# Altium footprint library PCBLIB.PcbLib: 103 footprints (part 6 of 7)
Each footprint in its own frame and in the unit in brackets; x right, y up, seen from the top. Pads: shape width x height; smd on the part's side, far side on the other; paste and mask are expansions set on the pad; w line width, h text height; cw(c..) or ccw(c..) is an arc to the next point about the centre after c.
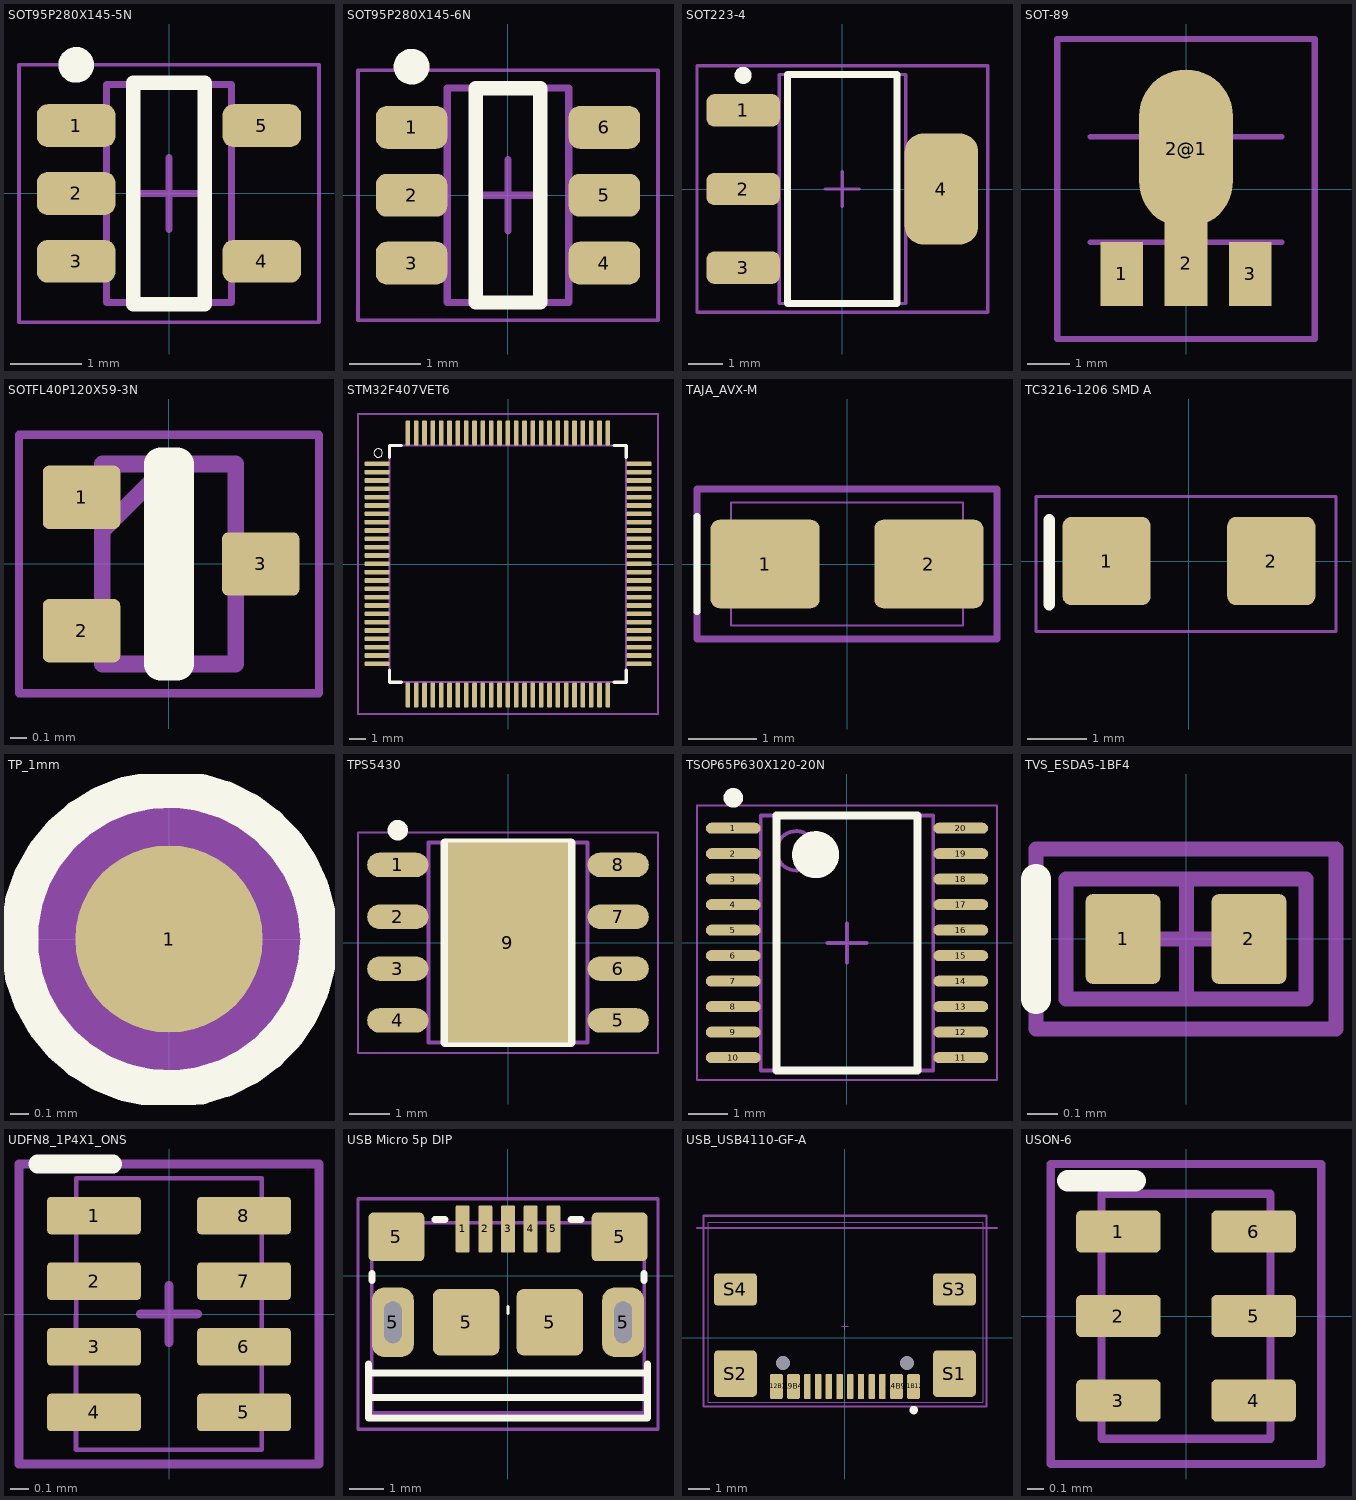
[diagram p5: the footprints below, top view; thin cyan lines are the x and y axes]

## SOT95P280X145-5N [mm]
pads (5):
  rrect50% 1.1x0.6 smd mask+0.05: 1(-1.3,0.95) 2(-1.3,0) 3(-1.3,-0.95) 4(1.3,-0.95) 5(1.3,0.95)
Top Overlay:
  circle w0.25: c-1.3,1.8 r0.125
  lines w0.2: -0.5,-1.55 -0.5,1.55 0.5,1.55 0.5,-1.55 -0.5,-1.55
Top Component Outline:
  lines w0.05: -2.1,-1.8 -2.1,1.8 2.1,1.8 2.1,-1.8 -2.1,-1.8
Top Assembly:
  lines w0.1: -0.875,-1.525 -0.875,1.525 0.875,1.525 0.875,-1.525 -0.875,-1.525
Top Designator:
  text ".Designator" at -1.578,-0.046 h0.7
Bottom 3D Body:
  lines w0.1: -0.5,0 0.5,0 ; 0,-0.5 0,0.5
3D body "SOT95P280X145-5N.step": height 1.45, standoff 0, extent -1.5,-1.525 1.5,1.525

## SOT95P280X145-6N [mm]
pads (6):
  rrect50% 1x0.6 smd mask+0.05: 1(-1.35,0.95) 2(-1.35,0) 3(-1.35,-0.95) 4(1.35,-0.95) 5(1.35,0) 6(1.35,0.95)
Top Overlay:
  circle w0.25: c-1.35,1.8 r0.125
  lines w0.2: -0.45,-1.5 0.45,-1.5 0.45,1.5 -0.45,1.5 -0.45,-1.5
Top Component Outline:
  lines w0.05: -2.1,-1.75 2.1,-1.75 2.1,1.75 -2.1,1.75 -2.1,-1.75
Top Assembly:
  lines w0.1: -0.85,-1.5 -0.85,1.5 0.85,1.5 0.85,-1.5 -0.85,-1.5
Bottom Designator:
  text ".Comment" at -0.133,1.091 h0.64
Mechanical 11:
  text ".Designator" at -0.133,1.091 h0.64
Bottom 3D Body:
  lines w0.1: -0.5,0 0.5,0 ; 0,-0.5 0,0.5
3D body "SOT95P280X145-6N.step": height 1.45, standoff 0, extent -1.5,-1.5 1.5,1.5

## SOT223-4 [mm]
pads (4):
  rrect50% 2.15x0.95 smd mask+0.05: 1(-2.9,2.3) 2(-2.9,0) 3(-2.9,-2.3)
  rrect50% 2.15x3.25 smd mask+0.05: 4(2.9,0)
Top Overlay:
  circle w0.25: c-2.9,3.325 r0.125
  lines w0.2: -1.6,-3.35 1.6,-3.35 1.6,3.35 -1.6,3.35 -1.6,-3.35
Top Component Outline:
  lines w0.1: -0.5,0 0.5,0 ; 0,-0.5 0,0.5 ; -4.25,-3.6 -4.25,3.6 4.25,3.6 4.25,-3.6 -4.25,-3.6
Top Designator:
  text ".Value" at -1.019,-0.249 h0.8
Top Courtyard:
  text ".Comment" at -0.187,1.218 h0.64
Top 3D Body:
  lines w0.1: -1.85,-3.35 1.85,-3.35 1.85,3.35 -1.85,3.35 -1.85,-3.35
  text ".Designator" at -0.187,1.218 h0.64
3D body "SOT230P700X180-4N.step": height 1.8, standoff 0, extent -3.5,-3.35 3.5,3.35

## SOT-89 [mm]
pads (4):
  rect 1x1.5 smd paste-2 mask+0: 1(-1.499,-1.981) 3(1.499,-1.981)
  rect 1x2 smd paste-2 mask+0: 2(0,-1.727)
  oval 2.2x3.7 smd paste-3: 2@1(0,0.94)
Top Paste:
  region: 0.9,0 -0.901,0 -0.901,2.2 0.9,2.2
  region: -1.1,-2.684 -1.903,-2.684 -1.903,-1.28 -1.1,-1.28
  region: 1.9,-2.682 1.101,-2.682 1.101,-1.28 1.9,-1.28
  region: 0.4,-2.683 -0.4,-2.683 -0.4,-1.28 0.4,-1.28
Top Solder:
  region: 0.525,-2.776 -0.525,-2.776 -0.525,-1.2 0.525,-1.2
  region: 2.025,-2.78 0.977,-2.78 0.977,-1.2 2.025,-1.2
  region: -0.975,-2.779 -2.028,-2.779 -2.028,-1.2 -0.975,-1.2
Top Component Outline:
  lines w0.15: -3,-3.5 -3,3.5 3,3.5 3,-3.5 -3,-3.5
Bottom Courtyard:
  region: 0.787,1.575 0.787,1.295 -0.787,1.295 -0.787,1.321 -0.787,1.575 -0.356,2.007 0.356,2.007
  region: 0.279,-2.111 -0.28,-2.111 -0.28,-1.27 0.279,-1.27
  region: 1.727,-2.108 1.27,-2.108 1.27,-1.27 1.727,-1.27
  region: -1.27,-2.11 -1.728,-2.11 -1.728,-1.27 -1.27,-1.27
  lines w0.127: -2.235,-1.245 2.235,-1.245 ; -2.235,1.219 2.235,1.219
  lines w0.2: -0.787,1.295 -0.787,1.575 -0.356,2.007 0.356,2.007 0.787,1.575 0.787,1.295 -0.787,1.295
3D body "step_temp.STEP": height 1.6, standoff 0, extent -2.275,-2.292 2.275,1.877

## SOTFL40P120X59-3N [mm]
pads (3):
  rrect20% 0.465x0.38 smd mask+0.05: 1(-0.525,0.4) 2(-0.525,-0.4) 3(0.55,0)
Top Overlay:
  lines w0.2: -0.05,-0.6 -0.05,0.6 0.05,0.6 0.05,-0.6 -0.05,-0.6
Top Component Outline:
  lines w0.05: -0.9,-0.775 -0.9,0.775 0.9,0.775 0.9,-0.775 -0.9,-0.775
Top Assembly:
  lines w0.1: -0.4,0.2 0,0.6 ; -0.4,-0.6 -0.4,0.6 0.4,0.6 0.4,-0.6 -0.4,-0.6
3D body "ESD5V3U2U03FH6327XTSA1.stp": height 0.59, standoff 0, extent -0.6,-0.6 0.6,0.6

## STM32F407VET6 [mm]
height 9
pads (100):
  rrect50% 1.5x0.28 smd mask+0.05: 1(-7.862,6.013) 2(-7.862,5.512) 3(-7.862,5.012) 4(-7.862,4.513) 5(-7.862,4.012) 6(-7.862,3.512) 7(-7.862,3.012) 8(-7.862,2.512) 9(-7.862,2.013) 10(-7.862,1.512) 11(-7.862,1.013) 12(-7.862,0.512) 13(-7.862,0.012) 14(-7.862,-0.487) 15(-7.862,-0.988) 16(-7.862,-1.488) 17(-7.862,-1.988) 18(-7.862,-2.488) 19(-7.862,-2.987) 20(-7.862,-3.488) 21(-7.862,-3.988) 22(-7.862,-4.488) 23(-7.862,-4.988) 24(-7.862,-5.487) 25(-7.862,-5.988) 51(7.862,-5.99) 52(7.862,-5.49) 53(7.862,-4.99) 54(7.862,-4.49) 55(7.862,-3.99) 56(7.862,-3.49) 57(7.862,-2.99) 58(7.862,-2.49) 59(7.862,-1.99) 60(7.862,-1.49) 61(7.862,-0.99) 62(7.862,-0.49) 63(7.862,0.01) 64(7.862,0.51) 65(7.862,1.01) 66(7.862,1.51) 67(7.862,2.01) 68(7.862,2.51) 69(7.862,3.01) 70(7.862,3.51) 71(7.862,4.01) 72(7.862,4.51) 73(7.862,5.01) 74(7.862,5.51) 75(7.862,6.01)
  rrect50% 0.28x1.5 smd mask+0.05: 26(-6.009,-7.866) 27(-5.509,-7.866) 28(-5.009,-7.866) 29(-4.509,-7.866) 30(-4.009,-7.866) 31(-3.509,-7.866) 32(-3.009,-7.866) 33(-2.509,-7.866) 34(-2.009,-7.866) 35(-1.509,-7.866) 36(-1.009,-7.866) 37(-0.509,-7.866) 38(-0.009,-7.866) 39(0.491,-7.866) 40(0.991,-7.866) 41(1.491,-7.866) 42(1.991,-7.866) 43(2.491,-7.866) 44(2.991,-7.866) 45(3.491,-7.866) 46(3.991,-7.866) 47(4.491,-7.866) 48(4.991,-7.866) 49(5.491,-7.866) 50(5.991,-7.866) 76(5.991,7.866) 77(5.491,7.866) 78(4.991,7.866) 79(4.491,7.866) 80(3.991,7.866) 81(3.491,7.866) 82(2.991,7.866) 83(2.491,7.866) 84(1.991,7.866) 85(1.491,7.866) 86(0.991,7.866) 87(0.491,7.866) 88(-0.009,7.866) 89(-0.509,7.866) 90(-1.009,7.866) 91(-1.509,7.866) 92(-2.009,7.866) 93(-2.509,7.866) 94(-3.009,7.866) 95(-3.509,7.866) 96(-4.009,7.866) 97(-4.509,7.866) 98(-5.009,7.866) 99(-5.509,7.866) 100(-6.009,7.866)
Top Overlay:
  circle w0: c-7.787,6.656 r0.254
  lines w0.203: -7.109,-6.382 -7.109,-7.088 -6.403,-7.088 ; -7.109,6.407 -7.109,7.113 -6.403,7.113 ; 6.385,-7.088 7.091,-7.088 7.091,-6.382 ; 6.385,7.113 7.091,7.113 7.091,6.407
Top Component Outline:
  lines w0.1: -9,-9 -9,9 9,9 9,-9 -9,-9
Bottom Courtyard:
  lines w0.12: -7.109,-7.088 7.091,-7.088 7.091,7.113 -7.109,7.113 -7.109,-7.088
3D body "step_temp.STEP": height 1.56, standoff -0.04, extent -8.009,-7.987 7.991,8.012

## TAJA_AVX-M [mm]
pads (2):
  rrect20% 1.6x1.3 smd paste+0 mask+0: 1(-1.2,0) 2(1.2,0)
Top Overlay:
  lines w0.1: -2.2,-0.7 -2.2,0.7
Top Component Outline:
  lines w0.1: -2.2,-1.1 2.2,-1.1 2.2,1.1 -2.2,1.1 -2.2,-1.1
Top Assembly:
  lines w0.025: -1.702,-0.902 -1.702,0.902 1.702,0.902 1.702,-0.902 -1.702,-0.902
Bottom Courtyard:
  circle w0: c-1.448,0 r0.076
3D body "TAJA_AVX.step": height 1.85, standoff 0, extent -1.702,-0.902 1.702,0.902

## TC3216-1206 SMD A [mm] "Capacitor, SM Tantalum; Body 3.2 x 1.6 mm (LxW typ)"
height 2.2
pads (2):
  rrect20% 1.5x1.5 smd: 1(-1.4,0) 2(1.4,0)
Top Overlay:
  lines w0.2: -2.375,-0.737 -2.375,0.699
Top Component Outline:
  lines w0.05: -2.6,-1.2 -2.6,1.1 2.5,1.1 2.5,-1.2 -2.6,-1.2
Top Designator:
  text ".Designator" at 1.528,0.108 h0.7
3D body "User Library-CAP_TANT_3216-18_A_case.step": height 1.8, standoff 0, extent -1.7,-0.9 1.7,0.9

## TP_1mm [mm] "Surface"
height 1.2
pads (1):
  round 1 smd paste+0: 1(0,0)
Top Overlay:
  circle w0.2: c0,0 r0.8
Mechanical 1:
  pour cut-out: 0,-0.721 -0.071,-0.721 -0.21,-0.693 -0.342,-0.639 -0.46,-0.56 -0.56,-0.46 -0.639,-0.342 -0.693,-0.21 -0.721,-0.071 -0.721,0 -0.721,0.071 -0.693,0.21 -0.639,0.342 -0.56,0.46 -0.46,0.56 -0.342,0.639 -0.21,0.693 -0.071,0.721 0,0.721 0.071,0.721 0.21,0.693 0.342,0.639 0.46,0.56 0.56,0.46 0.639,0.342 0.693,0.21 0.721,0.071 0.721,0 0.721,-0.071 0.693,-0.21 0.639,-0.342 0.56,-0.46 0.46,-0.56 0.342,-0.639 0.21,-0.693 0.071,-0.721
Top Designator:
  text ".Value" at 1.019,0.249 h0.8
3D body: height 0.02, standoff 0, extent -0.5,-0.5 0.5,0.5

## TPS5430 [mm]
pads (11):
  oval 1.5x0.6 smd mask+0.05: 1(-2.7,1.905) 2(-2.7,0.635) 3(-2.7,-0.635) 4(-2.7,-1.905) 5(2.7,-1.905) 6(2.7,-0.635) 7(2.7,0.635) 8(2.7,1.905)
  rect 2.95x4.9 smd paste-10 mask+0.102: 9(0,0)
  rect 2.4x3 on Top Solder: ""(0,0)
  rect 2.4x3 on Top Paste: ""(0,0)
Top Overlay:
  circle w0.6: c-0.55,1.45 r0.3
  circle w0.25: c-2.7,2.755 r0.125
  lines w0.2: -1.55,-2.45 1.55,-2.45 1.55,2.45 -1.55,2.45 -1.55,-2.45
Top Component Outline:
  lines w0.05: -3.675,-2.7 -3.675,2.7 3.675,2.7 3.675,-2.7 -3.675,-2.7
Top Assembly:
  lines w0.1: -1.95,-2.45 1.95,-2.45 1.95,2.45 -1.95,2.45 -1.95,-2.45
Bottom Courtyard:
  circle w0.1: c-1.05,1.55 r0.5
Bottom 3D Body:
  lines w0.1: -0.5,0 0.5,0 ; 0,-0.5 0,0.5
3D body "TPS5430DDAR.stp": height 1.57, standoff 0, extent -3.014,-2.45 3.014,2.45

## TSOP65P630X120-20N [mm] "TSOP, 20-Leads, Body 6.45x4.35mm, Pitch 0.65mm, IPC Medium Density"
height 1.2
pads (20):
  oval 1.4x0.28 smd mask+0.102: 1(-2.9,2.925) 2(-2.9,2.275) 3(-2.9,1.625) 4(-2.9,0.975) 5(-2.9,0.325) 6(-2.9,-0.325) 7(-2.9,-0.975) 8(-2.9,-1.625) 9(-2.9,-2.275) 10(-2.9,-2.925) 11(2.9,-2.925) 12(2.9,-2.275) 13(2.9,-1.625) 14(2.9,-0.975) 15(2.9,-0.325) 16(2.9,0.325) 17(2.9,0.975) 18(2.9,1.625) 19(2.9,2.275) 20(2.9,2.925)
Top Overlay:
  circle w0.6: c-0.8,2.25 r0.3
  circle w0.25: c-2.9,3.7 r0.125
  lines w0.2: -1.8,-3.25 1.8,-3.25 1.8,3.25 -1.8,3.25 -1.8,-3.25
Top Assembly:
  circle w0.1: c-1.3,2.35 r0.5
  lines w0.1: -2.2,-3.25 2.2,-3.25 2.2,3.25 -2.2,3.25 -2.2,-3.25
Top Courtyard:
  lines w0.05: -3.825,-3.5 3.825,-3.5 3.825,3.5 -3.825,3.5 -3.825,-3.5
  lines w0.1: -0.5,0 0.5,0 ; 0,-0.5 0,0.5
3D body "TSOP65P630X120-20N.step": height 1.2, standoff 0, extent -3.15,-3.25 3.15,3.25

## TVS_ESDA5-1BF4 [mm] "TVS DIODE 5VWM 11VC SMC"
pads (2):
  rrect20% 0.25x0.3 smd mask+0.05: 1(-0.21,0) 2(0.21,0)
Top Overlay:
  lines w0.1: -0.5,-0.2 -0.5,0.2
Top Component Center:
  lines w0.05: -0.199,0 0.201,0 ; 0.001,-0.2 0.001,0.2
Top Component Outline:
  lines w0.05: -0.5,-0.3 0.5,-0.3 0.5,0.3 -0.5,0.3 -0.5,-0.3
Top Assembly:
  lines w0.05: -0.4,-0.2 -0.4,0.2 0.4,0.2 0.4,-0.2 -0.4,-0.2
3D body: height 0.3, standoff 0, extent -0.299,-0.15 0.301,0.15

## UDFN8_1P4X1_ONS [mm]
pads (8):
  rrect20% 0.5x0.2 smd paste+0 mask+0.05: 1(-0.4,0.525) 2(-0.4,0.175) 3(-0.4,-0.175) 4(-0.4,-0.525) 5(0.4,-0.525) 6(0.4,-0.175) 7(0.4,0.175) 8(0.4,0.525)
Top Overlay:
  lines w0.1: -0.7,0.8 -0.3,0.8
Top Component Center:
  lines w0.05: -0.15,0 0.15,0 ; 0,-0.15 0,0.15
Top Component Outline:
  lines w0.05: -0.8,-0.8 0.8,-0.8 0.8,0.8 -0.8,0.8 -0.8,-0.8
Top Assembly:
  lines w0.025: -0.495,-0.724 0.495,-0.724 0.495,0.724 -0.495,0.724 -0.495,-0.724
  text ".Designator" at -0.897,-0.09 h0.4
3D body "UDFN8_1P4X1_ONS.step": height 0.56, standoff 0, extent -0.495,-0.724 0.495,0.724

## USB Micro 5p DIP [mm]
height 9
pads (11):
  rrect20% 0.4x1.35 smd mask+0.05: 1(-1.3,1.338) 2(-0.65,1.338) 3(0,1.338) 4(0.65,1.338) 5(1.3,1.338)
  rrect60% 1.2x2 hole 0.5 slot 1.2 at 90 deg: 5(-3.3,-1.338) 5(3.3,-1.338)
  rrect20% 1.6x1.4 smd mask+0.05: 5(-3.2,1.113) 5(3.2,1.113)
  rrect20% 1.9x1.9 smd paste-10 mask+0.05: 5(-1.2,-1.338) 5(1.2,-1.338)
Top Overlay:
  lines w0.08: 0,-1.088 0,-0.888
  lines w0.2: -4,-3.488 4,-3.488 ; -4,-2.788 4,-2.788 ; -4,-2.538 -4,-4.088 4,-4.088 4,-2.538 ; -3.9,-0.138 -3.9,0.062 ; -2.1,1.612 -1.8,1.612 ; 1.8,1.612 2.1,1.612 ; 3.9,-0.138 3.9,0.062
Top Component Outline:
  lines w0.1: -4.3,-4.4 -4.3,2.2 4.3,2.2 4.3,-4.4 -4.3,-4.4
Top Assembly:
  lines w0.1: -3.9,-3.938 3.9,-3.938 3.9,1.512 -3.9,1.512 -3.9,-3.938
Mechanical 29:
  text ".Designator" at 0.6,-2.538 h0.6
3D body "10118193.step": height 2.85, standoff -0.75, extent -3.929,-4.098 3.928,1.562
3D body "USBFIREWIRE_COM-MCBS.step": height 5.25, standoff -2.75, extent -6,-28.462 6,1.138

## USB_USB4110-GF-A [mm] "USB Type C 2.0 Conn Rec Mid-Mount One Ro"
pads (18):
  round 0 hole 0.65 unplated mask+0.05: 5(-2.89,-1.165) 6(2.89,-1.165)
  rrect20% 0.6x1.15 smd mask+0.05: A1B12(3.2,-2.265) A4B9(2.4,-2.265) A9B4(-2.4,-2.265) A12B1(-3.2,-2.265)
  rrect20% 0.3x1.15 smd mask+0.05: A5(1.25,-2.265) A6(0.25,-2.265) A7(-0.25,-2.265) A8(-1.25,-2.265) B5(-1.75,-2.265) B6(-0.75,-2.265) B7(0.75,-2.265) B8(1.75,-2.265)
  rrect20% 2x2.18 smd mask+0.05: S1(5.11,-1.665) S2(-5.11,-1.665)
  rrect20% 2x1.5 smd mask+0.05: S3(5.11,2.265) S4(-5.11,2.265)
Top Overlay:
  circle w0.2: c3.21,-3.365 r0.1
Mechanical 1:
  lines w0.1: -6.903,5.135 -4.727,5.135 4.922,5.135 7.098,5.135
Top Component Outline:
  lines w0.1: -6.6,-3.2 -6.6,5.7 6.6,5.7 6.6,-3.2 -6.6,-3.2
Top Assembly:
  lines w0.05: -6.375,-3 6.45,-3 6.45,5.41 -6.375,5.41 -6.375,-3
  text ".Designator" at 1.131,0.235 h1
Top Designator:
  text ".Designator" at -0.8,0.857 h0.4
Mechanical 11:
  lines w0.05: -0.15,0.535 0.15,0.535 ; 0,0.385 0,0.685
3D body "USB4110-GF-A.stp": height 3.23, standoff -0.65, extent -5.65,-2.565 5.65,5.135

## USON-6 [mm]
pads (6):
  rrect25% 0.5x0.25 smd mask+0.05: 1(-0.4,0.5) 2(-0.4,0) 3(-0.4,-0.5) 4(0.4,-0.5) 5(0.4,0) 6(0.4,0.5)
Top Overlay:
  lines w0.127: -0.7,0.8 -0.3,0.8
Top Component Outline:
  lines w0.05: -0.8,-0.875 0.8,-0.875 0.8,0.9 -0.8,0.9 -0.8,-0.875
Top Assembly:
  lines w0.05: -0.5,-0.725 -0.5,0.725 0.5,0.725 0.5,-0.725 -0.5,-0.725
3D body "step_temp.STEP": height 0.6, standoff 0, extent -0.5,-0.725 0.5,0.725